# Altium footprint library Test.PcbLib: 245 footprints (part 2 of 17)
Each footprint in its own frame and in the unit in brackets; x right, y up, seen from the top. Pads: shape width x height; smd on the part's side, far side on the other; paste and mask are expansions set on the pad; w line width, h text height; cw(c..) or ccw(c..) is an arc to the next point about the centre after c.
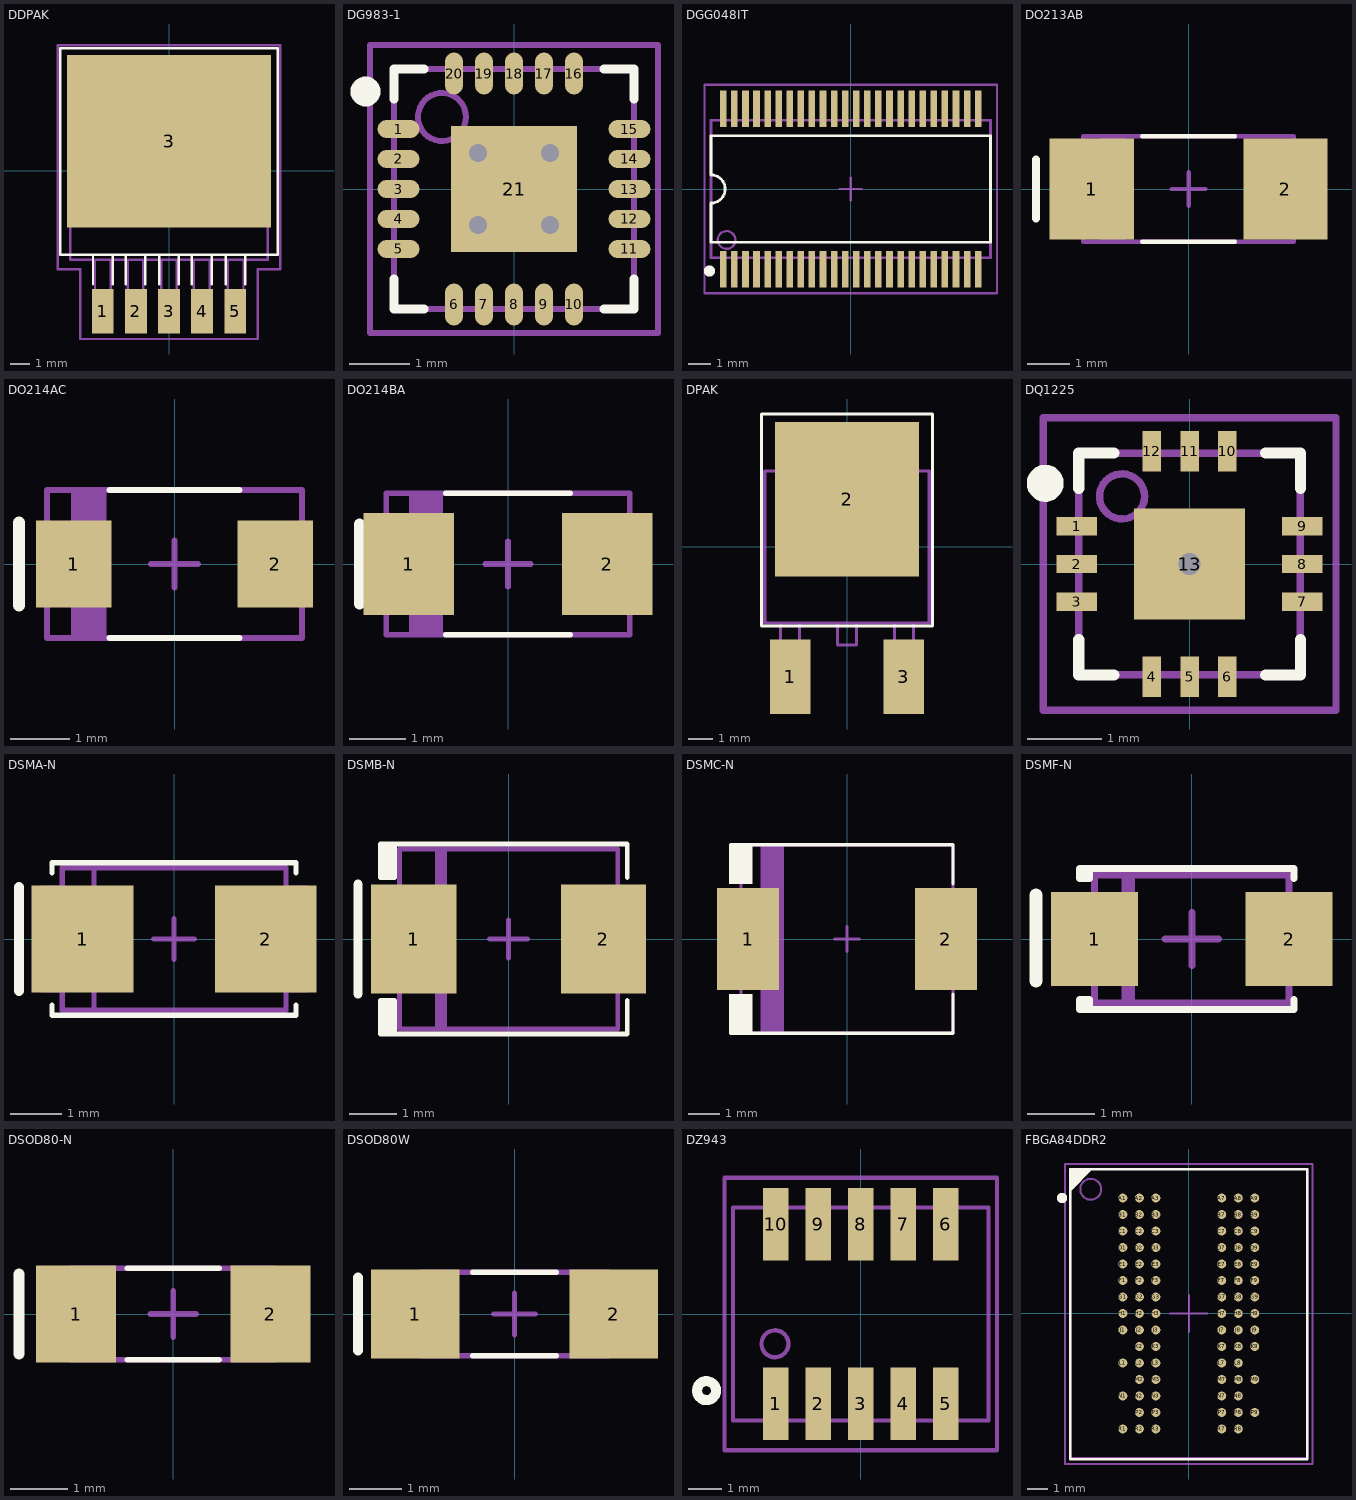
[diagram p1: the footprints below, top view; thin cyan lines are the x and y axes]

## DDPAK [mil]
height 137.8
pads (6):
  rect 44x90 smd: 1(-134,-285) 2(-67,-285) 3(0,-285) 4(67,-285) 5(134,-285)
  rect 414.02x350 smd paste-393.7: 3(0,60)
Top Overlay:
  lines w5: -154,-230 -154,-170 ; -114,-230 -114,-170 ; -88,-230 -88,-170 ; -48,-230 -48,-170 ; -20,-230 -20,-170 ; 20,-230 20,-170 ; 46,-230 46,-170 ; 87,-230 87,-170 ; 115,-230 115,-170 ; 155,-230 155,-170 ; -220,-170 -220,248 220,248 220,-170 -220,-170
Top Paste:
  circle w35.43: c165.35,190.79 r17.72
  circle w35.43: c82.68,190.79 r17.72
  circle w35.43: c-165.35,190.79 r17.72
  circle w35.43: c-82.68,190.79 r17.72
  circle w35.43: c0,190.79 r17.72
  circle w35.43: c165.35,104.17 r17.72
  circle w35.43: c82.68,104.17 r17.72
  circle w35.43: c-165.35,104.17 r17.72
  circle w35.43: c-82.68,104.17 r17.72
  circle w35.43: c0,104.17 r17.72
  circle w35.43: c165.35,17.56 r17.72
  circle w35.43: c82.68,17.56 r17.72
  circle w35.43: c-165.35,17.56 r17.72
  circle w35.43: c-82.68,17.56 r17.72
  circle w35.43: c0,17.56 r17.72
  circle w35.43: c0,-69.06 r17.72
  circle w35.43: c-82.68,-69.06 r17.72
  circle w35.43: c-165.35,-69.06 r17.72
  circle w35.43: c82.68,-69.06 r17.72
  circle w35.43: c165.35,-69.06 r17.72
Mechanical 13:
  lines w5: -150,-180 -150,-325 -118,-325 -118,-180 ; -84,-180 -84,-325 -52,-325 -52,-180 ; -16,-180 -16,-325 16,-325 16,-180 ; 50,-180 50,-325 83,-325 83,-180 ; 119,-180 119,-325 151,-325 151,-180 ; -200,-180 -200,215 -120,230 120,230 200,215 200,-180 -200,-180
  lines w6: -200,170 200,170
Mechanical 15:
  lines w4: -40,-10 40,-10 ; 0,-50 0,30
  lines w5: -225,-200 -225,254 225,254 225,-200 180,-200 180,-341 -180,-341 -180,-200 -225,-200
3D body: height 118.11, standoff 98.43, extent -16,-240 16,-180
3D body: height 175, standoff 0, extent -200,-180 200,170
3D body: height 50, standoff 0, extent -200,170 200,230
3D body: height 98.43, standoff 0, extent -16,-240 16,-220
3D body: height 19.68, standoff 0, extent -16,-325 16,-240
3D body: height 19.68, standoff 0, extent -84,-325 -52,-240
3D body: height 98.43, standoff 0, extent -84,-240 -52,-220
3D body: height 118.11, standoff 98.43, extent -84,-240 -52,-180
3D body: height 19.68, standoff 0, extent -150,-325 -118,-240
3D body: height 98.43, standoff 0, extent -150,-240 -118,-220
3D body: height 118.11, standoff 98.43, extent -150,-240 -118,-180
3D body: height 19.68, standoff 0, extent 50,-325 82,-240
3D body: height 98.43, standoff 0, extent 50,-240 82,-220
3D body: height 118.11, standoff 98.43, extent 50,-240 82,-180
3D body: height 19.68, standoff 0, extent 119,-325 151,-240
3D body: height 98.43, standoff 0, extent 119,-240 151,-220
3D body: height 118.11, standoff 98.43, extent 119,-240 151,-180

## DG983-1 [mm] "QFN, 20-Leads, Body 4,0x4,0mm (max), Pitch 0,50mm, IPC Medium Density"
height 0.9
pads (21):
  oval 0.7x0.3 smd mask+0.025: 1(-1.925,1) 2(-1.925,0.5) 3(-1.925,0) 4(-1.925,-0.5) 5(-1.925,-1) 11(1.925,-1) 12(1.925,-0.5) 13(1.925,0) 14(1.925,0.5) 15(1.925,1)
  oval 0.3x0.7 smd mask+0.025: 6(-1,-1.925) 7(-0.5,-1.925) 8(0,-1.925) 9(0.5,-1.925) 10(1,-1.925) 16(1,1.925) 17(0.5,1.925) 18(0,1.925) 19(-0.5,1.925) 20(-1,1.925)
  rect 2.1x2.1 smd paste-5 mask-5: 21(0,0)
via -0.6,-0.6 diameter 0.65 hole 0.3
via -0.6,0.6 diameter 0.65 hole 0.3
via 0.6,0.6 diameter 0.65 hole 0.3
via 0.6,-0.6 diameter 0.65 hole 0.3
Top Overlay:
  circle w0.25: c-2.475,1.625 r0.125
  lines w0.15: -2,-1.5 -2,-2 -1.5,-2 ; -2,1.5 -2,2 -1.5,2 ; 1.5,-2 2,-2 2,-1.5 ; 1.5,2 2,2 2,1.5
Top Paste:
  region: -0.25,0.45 -0.45,0.25 -0.45,-0.25 -0.25,-0.45 0.25,-0.45 0.45,-0.25 0.45,0.25 0.25,0.45
  region: -1.05,-0.725 -0.975,-0.725 -0.75,-0.95 -0.75,-1.05 -1.05,-1.05
  region: -0.45,-1.05 -0.45,-0.95 -0.25,-0.75 0.25,-0.75 0.45,-0.95 0.45,-1.05
  region: 1.05,-0.45 0.95,-0.45 0.75,-0.25 0.75,0.25 0.95,0.45 1.05,0.45
  region: 0.725,-1.05 0.725,-0.975 0.95,-0.75 1.05,-0.75 1.05,-1.05
  region: 0.45,1.05 0.45,0.95 0.25,0.75 -0.25,0.75 -0.45,0.95 -0.45,1.05
  region: 1.05,0.725 0.975,0.725 0.75,0.95 0.75,1.05 1.05,1.05
  region: -1.05,0.45 -0.95,0.45 -0.75,0.25 -0.75,-0.25 -0.95,-0.45 -1.05,-0.45
  region: -0.725,1.05 -0.725,0.975 -0.95,0.75 -1.05,0.75 -1.05,1.05
Top Solder:
  region: -1.1,1.1 -0.6,1.1 -0.6,0.906 -0.717,0.883 -0.816,0.816 -0.883,0.717 -0.906,0.6 -0.883,0.483 -0.816,0.384 -0.717,0.317 -0.6,0.294 -0.6,0.3 -0.6,0.294 -0.483,0.317 -0.384,0.384 -0.317,0.483 -0.294,0.6 -0.3,0.6 -0.294,0.6 -0.317,0.717 -0.384,0.816 -0.483,0.883 -0.6,0.906 -0.6,0.9 -0.6,1.1 0,1.1 0,0 -1.1,0
  region: -1.1,-1.1 -0.6,-1.1 -0.6,-0.906 -0.717,-0.883 -0.816,-0.816 -0.883,-0.717 -0.906,-0.6 -0.883,-0.483 -0.816,-0.384 -0.717,-0.317 -0.6,-0.294 -0.6,-0.3 -0.6,-0.294 -0.483,-0.317 -0.384,-0.384 -0.317,-0.483 -0.294,-0.6 -0.3,-0.6 -0.294,-0.6 -0.317,-0.717 -0.384,-0.816 -0.483,-0.883 -0.6,-0.906 -0.6,-0.9 -0.6,-1.1 0,-1.1 0,0 -1.1,0
  region: 1.1,-1.1 0.6,-1.1 0.6,-0.906 0.717,-0.883 0.816,-0.816 0.883,-0.717 0.906,-0.6 0.883,-0.483 0.816,-0.384 0.717,-0.317 0.6,-0.294 0.6,-0.3 0.6,-0.294 0.483,-0.317 0.384,-0.384 0.317,-0.483 0.294,-0.6 0.3,-0.6 0.294,-0.6 0.317,-0.717 0.384,-0.816 0.483,-0.883 0.6,-0.906 0.6,-0.9 0.6,-1.1 0,-1.1 0,0 1.1,0
  region: 1.1,1.1 0.6,1.1 0.6,0.906 0.717,0.883 0.816,0.816 0.883,0.717 0.906,0.6 0.883,0.483 0.816,0.384 0.717,0.317 0.6,0.294 0.6,0.3 0.6,0.294 0.483,0.317 0.384,0.384 0.317,0.483 0.294,0.6 0.3,0.6 0.294,0.6 0.317,0.717 0.384,0.816 0.483,0.883 0.6,0.906 0.6,0.9 0.6,1.1 0,1.1 0,0 1.1,0
Mechanical 13:
  circle w0.1: c-1.2,1.2 r0.4
  lines w0.1: -2,-2 -2,2 2,2 2,-2 -2,-2
Mechanical 15:
  lines w0.1: -0.5,0 0.5,0 ; -0.4,0 0.4,0 ; 0,-0.5 0,0.5 ; 0,-0.4 0,0.4 ; -2.4,-2.4 -2.4,2.4 2.4,2.4 2.4,-2.4 -2.4,-2.4
3D body: height 0.91, standoff 0.9, extent -1.6,0.8 -0.803,1.598
3D body: height 0.9, standoff 0.01, extent -2,-2 2,2

## DGG048IT [mm] "Shrink Small Outline; 48 Leads; Body Width 6.1 mm; Pitch 0.5 mm"
height 1.2
pads (48):
  rect 0.3x1.65 smd mask+0.051: 1(-5.75,-3.625) 2(-5.25,-3.625) 3(-4.75,-3.625) 4(-4.25,-3.625) 5(-3.75,-3.625) 6(-3.25,-3.625) 7(-2.75,-3.625) 8(-2.25,-3.625) 9(-1.75,-3.625) 10(-1.25,-3.625) 11(-0.75,-3.625) 12(-0.25,-3.625) 13(0.25,-3.625) 14(0.75,-3.625) 15(1.25,-3.625) 16(1.75,-3.625) 17(2.25,-3.625) 18(2.75,-3.625) 19(3.25,-3.625) 20(3.75,-3.625) 21(4.25,-3.625) 22(4.75,-3.625) 23(5.25,-3.625) 24(5.75,-3.625) 25(5.75,3.625) 26(5.25,3.625) 27(4.75,3.625) 28(4.25,3.625) 29(3.75,3.625) 30(3.25,3.625) 31(2.75,3.625) 32(2.25,3.625) 33(1.75,3.625) 34(1.25,3.625) 35(0.75,3.625) 36(0.25,3.625) 37(-0.25,3.625) 38(-0.75,3.625) 39(-1.25,3.625) 40(-1.75,3.625) 41(-2.25,3.625) 42(-2.75,3.625) 43(-3.25,3.625) 44(-3.75,3.625) 45(-4.25,3.625) 46(-4.75,3.625) 47(-5.25,3.625) 48(-5.75,3.625)
Top Overlay:
  circle w0.25: c-6.375,-3.7 r0.125
  lines w0.127: -6.3,-2.4 6.3,-2.4 6.3,2.4 -6.3,2.4 -6.3,0.635 cw(c-6.3,0) -6.3,-0.635 -6.3,-2.4
Mechanical 13:
  circle w0.1: c-5.6,-2.3 r0.4
  lines w0.127: -6.3,-3.1 -6.3,3.1 6.3,3.1 6.3,-3.1 -6.3,-3.1
Mechanical 15:
  lines w0.1: -0.508,0 0.508,0 ; 0,-0.508 0,0.508 ; -6.6,-4.7 6.6,-4.7 6.6,4.7 -6.6,4.7 -6.6,-4.7
3D body: height 1.2, standoff 0.13, extent -6.3,-3.1 6.3,3.1

## DO213AB [mm] "Diode MELF DO213AB"
height 2.5
pads (2):
  rect 2x2.4 smd: 1(-2.3,0) 2(2.3,0)
Top Overlay:
  lines w0.102: -1.1,-1.25 1.1,-1.25 ; -1.1,1.25 1.1,1.25
  lines w0.2: -3.625,-0.7 -3.625,0.7
Mechanical 13:
  lines w0.102: -2.05,-1.25 -2.05,1.25 ; -1.95,-1.25 -1.95,1.25 ; -1.85,-1.25 -1.85,1.25 ; -1.75,-1.25 -1.75,1.25 ; -1.65,-1.25 -1.65,1.25 ; -1.55,-1.25 -1.55,1.25 ; -2.5,-1.25 2.5,-1.25 2.5,1.25 -2.5,1.25 -2.5,-0.7 -2.5,-1.25
Mechanical 15:
  lines w0.102: -0.4,0 0.4,0 ; 0,-0.4 0,0.4
3D body: height 1.6, standoff 0, extent -2.5,-1.25 2.5,1.25

## DO214AC [mil] "Diode SMA DO214AC"
height 86.61
pads (2):
  rect 50x58 smd paste+0 mask+2: 1(-67,0) 2(67,0)
Top Overlay:
  lines w4.02: -43.31,-49.21 43.31,-49.21 ; -43.31,49.21 43.31,49.21
  lines w7.87: -103.35,-27.56 -103.35,27.56
Mechanical 13:
  lines w4.02: -66.93,-49.21 -66.93,49.21 ; -62.99,-49.21 -62.99,49.21 ; -59.06,-49.21 -59.06,49.21 ; -55.12,-49.21 -55.12,49.21 ; -51.18,-49.21 -51.18,49.21 ; -47.24,-49.21 -47.24,49.21 ; -84.65,-49.21 -84.65,-27.56 -84.65,49.21 84.65,49.21 84.65,-49.21 -84.65,-49.21
Mechanical 15:
  lines w4.02: -15.75,0 15.75,0 ; 0,-15.75 0,15.75
3D body: height 86.61, standoff 0, extent -84.65,-49.21 84.65,49.21
3D body: height 87.01, standoff 86.61, extent -68.9,-49.21 -45.28,49.21

## DO214BA [mm] "Diode SMA DO214BA"
height 3
pads (2):
  rect 1.6x1.8 smd paste+0 mask+0.051: 1(-1.75,0) 2(1.75,0)
Top Overlay:
  lines w0.102: -1.1,-1.25 1.1,-1.25 ; -1.1,1.25 1.1,1.25
  lines w0.2: -2.625,-0.7 -2.625,0.7
Mechanical 13:
  lines w0.102: -1.7,-1.25 -1.7,1.25 ; -1.6,-1.25 -1.6,1.25 ; -1.5,-1.25 -1.5,1.25 ; -1.4,-1.25 -1.4,1.25 ; -1.3,-1.25 -1.3,1.25 ; -1.2,-1.25 -1.2,1.25 ; -2.15,-1.25 2.15,-1.25 2.15,1.25 -2.15,1.25 -2.15,-0.7 -2.15,-1.25
Mechanical 15:
  lines w0.102: -0.4,0 0.4,0 ; 0,-0.4 0,0.4
3D body: height 2.75, standoff 0, extent -2.15,-1.25 2.15,1.25
3D body: height 2.76, standoff 2.75, extent -1.75,-1.25 -1.15,1.25

## DPAK [mil]
height 137.79
pads (3):
  rect 64x118 smd: 1(-90,-205) 3(90,-205)
  rect 228x244 smd paste-200: 2(0,75)
Top Overlay:
  lines w5: -135,-125 -135,210 135,210 135,-125 -135,-125
Top Paste:
  rectangle: -100,95 -10,190
  rectangle: 10,95 100,190
  rectangle: 10,-30 100,80
  rectangle: -100,-30 -10,80
Mechanical 13:
  lines w5: -105,-120 -105,-147.5 -105,-165 -110,-170 -110,-197.5 -105,-202.5 -105,-230 -75,-230 -75,-202.5 -70,-197.5 -70,-170 -75,-165 -75,-120 ; -100,120 -100,130 -100,150 -80,170 80,170 100,150 100,120 ; -15,-120 -15,-155 15,-155 15,-120 ; 75,-120 75,-147.5 75,-165 70,-170 70,-197.5 75,-202.5 75,-230 105,-230 105,-202.5 110,-197.5 110,-170 105,-165 105,-120 ; -130,-120 -130,120 130,120 130,-120 -130,-120
Mechanical 15:
  lines w5: -25,0 25,0 ; 0,-25 0,25
3D body: height 39.37, standoff 31.5, extent -13.78,-155.51 13.78,-120.08
3D body: height 7.87, standoff 0, extent 75.79,-230.31 103.35,-165.35
3D body: height 39.37, standoff 0, extent 75.79,-165.35 103.35,-157.48
3D body: height 39.37, standoff 31.5, extent 75.79,-165.35 103.35,-120.08
3D body: height 39.37, standoff 31.5, extent -103.35,-165.35 -75.79,-120.08
3D body: height 39.37, standoff 0, extent -103.35,-165.35 -75.79,-157.48
3D body: height 7.87, standoff 0, extent -103.35,-230.31 -75.79,-165.35
3D body: height 90, standoff 0, extent -130,-120 130,120
3D body: height 20, standoff 0, extent -100,120 100,170

## DQ1225 [mm] "QFN, 12-Leads, Body 3,0x3,0mm (max), Pitch 0,51mm, IPC Medium Density"
height 0.89
pads (13):
  rect 0.55x0.25 smd mask+0.025: 1(-1.525,0.51) 2(-1.525,0) 3(-1.525,-0.51) 7(1.525,-0.51) 8(1.525,0) 9(1.525,0.51)
  rect 0.25x0.55 smd mask+0.025: 4(-0.51,-1.525) 5(0,-1.525) 6(0.51,-1.525) 10(0.51,1.525) 11(0,1.525) 12(-0.51,1.525)
  rect 1.5x1.5 smd paste-5 mask-5: 13(0,0)
via 0,0 diameter 0.65 hole 0.3
Top Overlay:
  circle w0.25: c-1.954,1.092 r0.125
  lines w0.15: -1.5,-1.025 -1.5,-1.5 -1.025,-1.5 ; -1.5,1.025 -1.5,1.5 -1.025,1.5 ; 1.025,-1.5 1.5,-1.5 1.5,-1.025 ; 1.025,1.5 1.5,1.5 1.5,1.025
Top Paste:
  region: -0.75,-0.15 -0.3,-0.15 -0.15,-0.3 0.15,-0.3 0.3,-0.15 0.75,-0.15 0.75,-0.75 -0.75,-0.75
  region: -0.75,0.15 -0.3,0.15 -0.15,0.3 0.15,0.3 0.3,0.15 0.75,0.15 0.75,0.75 -0.75,0.75
Top Solder:
  region: -0.8,0.8 0,0.8 0,0.331 -0.127,0.306 -0.234,0.234 -0.306,0.127 -0.331,0 -0.306,-0.127 -0.234,-0.234 -0.127,-0.306 0,-0.331 0.127,-0.306 0.234,-0.234 0.306,-0.127 0.331,0 0.306,0.127 0.234,0.234 0.127,0.306 0,0.331 0,0.325 0,0.8 0.8,0.8 0.8,-0.8 -0.8,-0.8
Mechanical 13:
  circle w0.1: c-0.914,0.914 r0.305
  lines w0.1: -1.5,-1.5 1.5,-1.5 1.5,1.5 -1.5,1.5 -1.5,-1.5
Mechanical 15:
  lines w0.1: -0.5,0 0.5,0 ; 0,-0.5 0,0.5 ; -1.981,-1.981 1.981,-1.981 1.981,1.981 -1.981,1.981 -1.981,-1.981
3D body: height 0.89, standoff 0.01, extent -1.5,-1.5 1.5,1.5
3D body: height 0.9, standoff 0.89, extent -1.219,0.61 -0.622,1.208

## DSMA-N [mm] "DIODE SMA normal"
height 2.3
pads (2):
  rect 2x2.1 smd: 1(-1.8,0) 2(1.8,0)
Top Overlay:
  lines w0.102: -2.4,-1.3 -2.4,-1.5 2.4,-1.5 2.4,-1.3 ; -2.4,1.3 -2.4,1.5 2.4,1.5 2.4,1.3
  lines w0.2: -3.05,-1.025 -3.05,1.025
Mechanical 13:
  lines w0.102: -2.2,-1 -2.6,-1 -2.6,1 -2.2,1 ; -1.575,-1.4 -1.575,1.4 ; 2.2,-1 2.6,-1 2.6,1 2.2,1 ; -2.2,-1.4 -2.2,1.4 2.2,1.4 2.2,-1.4 -2.2,-1.4
Mechanical 15:
  lines w0.102: -0.4,0 0.4,0 ; 0,-0.4 0,0.4
3D body: height 1.4, standoff 0, extent 2.2,-1 2.6,1
3D body: height 1.4, standoff 0, extent -2.6,-1 -2.2,1
3D body: height 2.41, standoff 2.4, extent -1.95,-1.4 -1.425,1.4
3D body: height 2.4, standoff 0, extent -2.2,-1.4 2.2,1.4

## DSMB-N [mm] "DIODE SMB normal"
height 2.4
pads (2):
  rect 1.8x2.3 smd: 1(-2,0) 2(2,0)
Top Overlay:
  lines w0.102: -2.5,-1.3 -2.5,-2 ; -2.5,1.3 -2.5,2 ; -2.4,-2 -2.4,-1.3 -2.6,-1.3 ; -2.4,2 -2.4,1.3 -2.6,1.3 ; 2.5,-1.3 2.5,-2 -2.5,-2 ; 2.5,1.3 2.5,2 -2.5,2 ; -2.6,-2 -2.7,-2 -2.7,-1.3 -2.6,-1.3 ; -2.6,-2 -2.5,-2 ; -2.6,-2 -2.6,-1.3 ; -2.6,1.3 -2.7,1.3 -2.7,2 -2.6,2 ; -2.6,1.3 -2.6,2 ; -2.6,2 -2.5,2
  lines w0.2: -3.175,-1.15 -3.175,1.15
Mechanical 13:
  lines w0.102: -2.3,-1 -2.6,-1 -2.6,1 -2.3,1 ; -1.5,-1.9 -1.5,1.9 ; -1.425,-1.9 -1.425,1.9 ; -1.35,-1.9 -1.35,1.9 ; 2.3,-1 2.6,-1 2.6,1 2.3,1 ; -2.3,-1.9 -2.3,1.9 2.3,1.9 2.3,-1.9 -2.3,-1.9
Mechanical 15:
  lines w0.102: -0.4,0 0.4,0 ; 0,-0.4 0,0.4
3D body: height 2.41, standoff 2.4, extent -1.725,-1.9 -1.3,1.9
3D body: height 1.4, standoff 0, extent 2.3,-1 2.6,1
3D body: height 1.4, standoff 0, extent -2.6,-1 -2.3,1
3D body: height 2.4, standoff 0, extent -2.3,-1.9 2.3,1.9

## DSMC-N [mm] "DIODE SMC normal DO-214AB"
height 2.6
pads (2):
  rect 2x3.3 smd: 1(-3.2,0) 2(3.2,0)
Top Overlay:
  rectangle: -3.81,1.778 -3.048,3.048
  rectangle: -3.81,-3.048 -3.048,-1.778
  lines w0.102: -3.759,-3.048 3.429,-3.048 3.429,-1.778 ; -3.759,3.048 3.429,3.048 3.429,1.778
Mechanical 13:
  rectangle: -2.794,-3.048 -2.032,3.048
  lines w0.102: -3.429,-1.524 -3.937,-1.524 -3.937,1.524 -3.429,1.524 ; 3.429,-1.524 3.937,-1.524 3.937,1.524 3.429,1.524 ; -3.429,-3.048 -3.429,3.048 3.429,3.048 3.429,-3.048 -3.429,-3.048
Mechanical 15:
  lines w0.102: -0.4,0 0.4,0 ; 0,-0.4 0,0.4
3D body: height 2.61, standoff 2.6, extent -2.794,-3.048 -2.032,3.048
3D body: height 1.35, standoff 0, extent 3.429,-1.524 3.937,1.524
3D body: height 1.35, standoff 0, extent -3.937,-1.524 -3.429,1.524
3D body: height 2.6, standoff 0.1, extent -3.429,-3.048 3.429,3.048

## DSMF-N [mm] "Diode SMF"
height 1
pads (2):
  rect 1.3x1.4 smd: 1(-1.45,0) 2(1.45,0)
Top Overlay:
  lines w0.102: 1.525,-0.9 1.525,-1.05 -1.525,-1.05 ; 1.525,0.9 1.525,1.05 -1.525,1.05 ; -1.675,-0.9 -1.525,-0.9 -1.525,-1.05 ; -1.675,-0.9 -1.675,-1.05 -1.525,-1.05 ; -1.675,-0.9 -1.525,-1.05 ; -1.675,0.9 -1.525,1.05 ; -1.675,0.9 -1.675,1.05 -1.525,1.05 ; -1.675,0.9 -1.525,0.9 -1.525,1.05
  lines w0.2: -2.325,-0.625 -2.325,0.65
Mechanical 13:
  lines w0.102: -1,-0.95 -1,0.95 ; -0.9,-0.95 -0.9,0.95 ; -1.45,-0.95 1.45,-0.95 1.45,0.95 -1.45,0.95 -1.45,-0.95
Mechanical 15:
  lines w0.102: -0.4,0 0.4,0 ; 0,-0.4 0,0.4
3D body: height 1.01, standoff 1, extent -1.225,-0.95 -0.85,0.95
3D body: height 1, standoff 0, extent -1.45,-0.95 1.45,0.95

## DSOD80-N [mm] "Diode SOD80"
height 1.6
pads (2):
  rect 1.4x1.7 smd: 1(-1.7,0) 2(1.7,0)
Top Overlay:
  lines w0.102: -0.8,-0.8 0.8,-0.8 ; -0.8,0.8 0.8,0.8
  lines w0.2: -2.7,-0.7 -2.7,0.7
Mechanical 13:
  lines w0.102: -1.475,0.8 -1.475,-0.8 -1.375,-0.8 -1.375,0.8 -1.275,0.8 -1.275,-0.8 -1.175,-0.8 -1.175,0.8 ; -1.8,-0.8 1.8,-0.8 1.8,0.8 -1.8,0.8 -1.8,0 -1.8,-0.8
Mechanical 15:
  lines w0.102: -0.4,0 0.4,0 ; 0,-0.4 0,0.4
3D body: height 1.73, standoff 0.07, extent -1.2,-0.827 -0.6,0.827
3D body: height 1.7, standoff 0.1, extent 1.4,-0.797 1.8,0.797
3D body: height 1.7, standoff 0.1, extent -1.8,-0.797 -1.4,0.797
3D body: height 1.7, standoff 0.1, extent -1.4,-0.797 1.4,0.797

## DSOD80W [mm] "Diode SOD80 wavw solder"
height 1.6
pads (2):
  rect 1.7x1.7 smd: 1(-1.9,0) 2(1.9,0)
Top Overlay:
  lines w0.102: -0.8,-0.8 0.8,-0.8 ; -0.8,0.8 0.8,0.8
  lines w0.2: -3,-0.7 -3,0.7
Mechanical 13:
  lines w0.102: -1.475,0.8 -1.475,-0.8 -1.375,-0.8 -1.375,0.8 -1.275,0.8 -1.275,-0.8 -1.175,-0.8 -1.175,0.8 ; -1.8,-0.8 -1.8,0 -1.8,0.8 1.8,0.8 1.8,-0.8 -1.8,-0.8
Mechanical 15:
  lines w0.102: -0.4,0 0.4,0 ; 0,-0.4 0,0.4
3D body: height 1.7, standoff 0.1, extent -1.4,-0.797 1.4,0.797
3D body: height 1.7, standoff 0.1, extent -1.8,-0.797 -1.4,0.797
3D body: height 1.7, standoff 0.1, extent 1.4,-0.797 1.8,0.797
3D body: height 1.73, standoff 0.07, extent -1.2,-0.827 -0.6,0.827

## DZ943 [mm] "DZ943 10pin RF module"
height 4.83
pads (10):
  rect 0.76x2.16 smd: 1(-2.54,-2.68) 2(-1.27,-2.68) 3(0,-2.68) 4(1.27,-2.68) 5(2.54,-2.68) 6(2.54,2.68) 7(1.27,2.68) 8(0,2.68) 9(-1.27,2.68)
  rect 0.76x2.16 smd mask+0.102: 10(-2.54,2.68)
Top Overlay:
  circle w0.3: c-4.602,-2.286 r0.284
Mechanical 13:
  circle w0.127: c-2.561,-0.889 r0.402
  lines w0.127: -3.81,-3.175 3.81,-3.175 3.81,3.175 -3.81,3.175 -3.81,-3.175
Mechanical 15:
  lines w0.127: -4.064,-4.064 4.064,-4.064 4.064,4.064 -4.064,4.064 -4.064,-4.064
3D body: height 4.84, standoff 4.8, extent -3.138,-2.214 -1.942,-1.016
3D body: height 4.83, standoff 0.83, extent -3.302,-2.667 3.302,2.667
3D body: height 0.83, standoff 0, extent -3.81,-3.175 3.81,3.175

## FBGA84DDR2 [mil] "BGA, 84-Leads, Body 14,0x11,5mm,  Pitch 0,80mm"
height 47.24
pads (84):
  round 17 smd: A1(-125.98,220.47) A2(-94.49,220.47) A3(-62.99,220.47) A7(62.99,220.47) A8(94.49,220.47) A9(125.98,220.47) B1(-125.98,188.98) B2(-94.49,188.98) B3(-62.99,188.98) B7(62.99,188.98) B8(94.49,188.98) B9(125.98,188.98) C1(-125.98,157.48) C2(-94.49,157.48) C3(-62.99,157.48) C7(62.99,157.48) C8(94.49,157.48) C9(125.98,157.48) D1(-125.98,125.98) D2(-94.49,125.98) D3(-62.99,125.98) D7(62.99,125.98) D8(94.49,125.98) D9(125.98,125.98) E1(-125.98,94.49) E2(-94.49,94.49) E3(-62.99,94.49) E7(62.99,94.49) E8(94.49,94.49) E9(125.98,94.49) F1(-125.98,62.99) F2(-94.49,62.99) F3(-62.99,62.99) F7(62.99,62.99) F8(94.49,62.99) F9(125.98,62.99) G1(-125.98,31.5) G2(-94.49,31.5) G3(-62.99,31.5) G7(62.99,31.5) G8(94.49,31.5) G9(125.98,31.5) H1(-125.98,0) H2(-94.49,0) H3(-62.99,0) H7(62.99,0) H8(94.49,0) H9(125.98,0) J1(-125.98,-31.5) J2(-94.49,-31.5) J3(-62.99,-31.5) J7(62.99,-31.5) J8(94.49,-31.5) J9(125.98,-31.5) K2(-94.49,-62.99) K3(-62.99,-62.99) K7(62.99,-62.99) K8(94.49,-62.99) K9(125.98,-62.99) L1(-125.98,-94.49) L2(-94.49,-94.49) L3(-62.99,-94.49) L7(62.99,-94.49) L8(94.49,-94.49) M2(-94.49,-125.98) M3(-62.99,-125.98) M7(62.99,-125.98) M8(94.49,-125.98) M9(125.98,-125.98) N1(-125.98,-157.48) N2(-94.49,-157.48) N3(-62.99,-157.48) N7(62.99,-157.48) N8(94.49,-157.48) P2(-94.49,-188.98) P3(-62.99,-188.98) P7(62.99,-188.98) P8(94.49,-188.98) P9(125.98,-188.98) R1(-125.98,-220.47) R2(-94.49,-220.47) R3(-62.99,-220.47) R7(62.99,-220.47) R8(94.49,-220.47)
Top Overlay:
  circle w9.84: c-242.13,220.47 r4.92
  region: -187.01,275.59 -226.38,236.22 -226.38,275.59
  lines w5: -226.38,236.22 -187.01,275.59 ; -226.38,-278.54 -226.38,275.59 226.38,275.59 226.38,-278.54 -226.38,-278.54
Mechanical 13:
  circle w3.94: c-187.32,237.2 r20
  lines w3.94: -226.38,-275.59 -226.38,275.59 226.38,275.59 226.38,-275.59 -226.38,-275.59
Mechanical 15:
  lines w3.94: -35.43,0 35.43,0 ; 0,-35.43 0,35.43 ; -236.22,-287.4 -236.22,285.43 236.22,285.43 236.22,-287.4 -236.22,-287.4
3D body: height 35.47, standoff 0, extent -207,217.09 -167.16,257.01
3D body: height 35.43, standoff 12.2, extent -226.38,-275.59 226.38,275.59